# Altium schematic symbol library jlcpcb_2025_04_capacitors_extended_0402.schlib: 3594 symbols (part 6 of 20) (continued)
## C1005NP0180KGTS (continued)
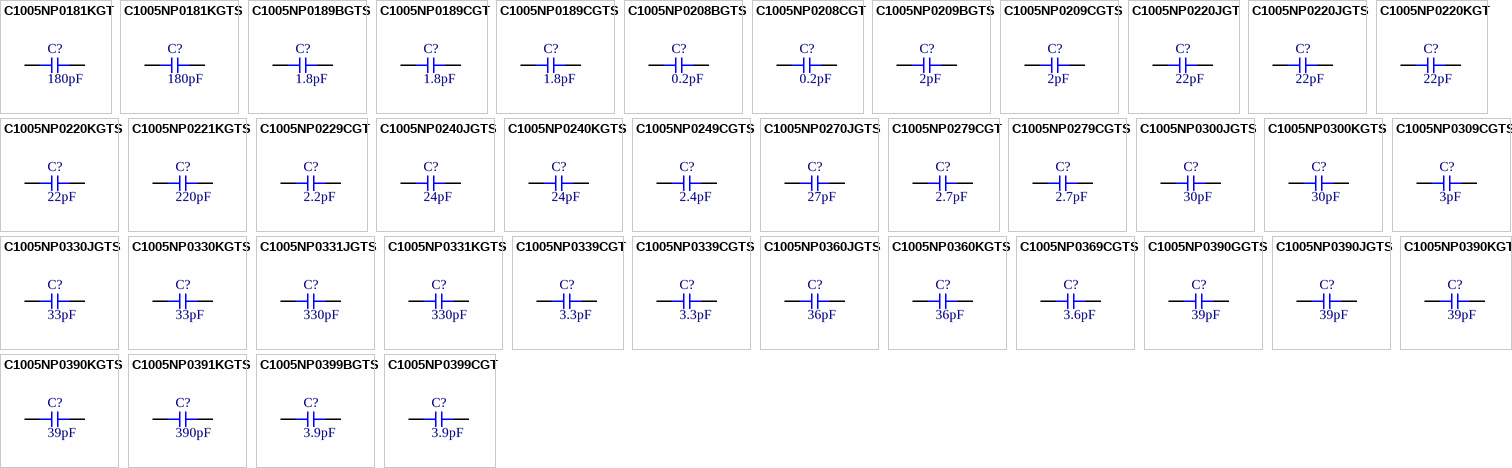
[diagram p24: symbols C1005NP0181KGT to C1005NP0399CGT]

## C1005NP0181KGT
designator C?  Capacitance: 180pF  (hidden comment: *)
Capacitor, Ceramic (MLCC), 180pF, ±10%, 50V, NP0, ±10%, SMD 0402; Manufacturer: Darfon Elec; Manufacturer Part Number: C1005NP0181KGT; Package Size: 0402; JLCPCB Basic Part: No; JLCPCB Part Number: C267388; Supplier 1: LCSC; Category: Capacitors - MLCC; Supplier Part Number 1: C267388; Tolerance: ±10%; Voltage Rating: 50V; Temperature Coefficient: NP0; RoHS: Yes; ComponentLink1Description: Datasheet; ComponentLink1URL: https://wmsc.lcsc.com/wmsc/upload/file/pdf/v2/lcsc/2304140030_Darfon-Elec-C1005NP0181KGT_C267388.pdf; ComponentLink2Description: JLCPCB Part URL; ComponentLink2URL: https://jlcpcb.com/partdetail/C267388; ComponentLink3Description: LCSC Part URL; ComponentLink3URL: https://lcsc.com/product-detail/Multilayer-Ceramic-Capacitors-MLCC---SMD-SMT_Darfon-Elec-Darfon-Elec-C1005NP0181KGT_C267388.html
footprint CAP-0402 (0402 (1005M) Capacitor)
pins: 1, 2

## C1005NP0181KGTS
designator C?  Capacitance: 180pF  (hidden comment: *)
Capacitor, Ceramic (MLCC), 180pF, ±10%, 50V, NP0, ±10%, SMD 0402; Manufacturer: Darfon Elec; Manufacturer Part Number: C1005NP0181KGTS; Package Size: 0402; JLCPCB Basic Part: No; JLCPCB Part Number: C312092; Supplier 1: LCSC; Category: Capacitors - MLCC; Supplier Part Number 1: C312092; Tolerance: ±10%; Voltage Rating: 50V; Temperature Coefficient: NP0; RoHS: Yes; ComponentLink1Description: Datasheet; ComponentLink1URL: https://wmsc.lcsc.com/wmsc/upload/file/pdf/v2/lcsc/2304140030_Darfon-Elec-C1005NP0181KGTS_C312092.pdf; ComponentLink2Description: JLCPCB Part URL; ComponentLink2URL: https://jlcpcb.com/partdetail/C312092; ComponentLink3Description: LCSC Part URL; ComponentLink3URL: https://lcsc.com/product-detail/Multilayer-Ceramic-Capacitors-MLCC---SMD-SMT_Darfon-Elec-Darfon-Elec-C1005NP0181KGTS_C312092.html
footprint CAP-0402 (0402 (1005M) Capacitor)
pins: 1, 2

## C1005NP0189BGTS
designator C?  Capacitance: 1.8pF  (hidden comment: *)
Capacitor, Ceramic (MLCC), 1.8pF, 50V, NP0, SMD 0402; Manufacturer: Darfon Elec; Manufacturer Part Number: C1005NP0189BGTS; Package Size: 0402; JLCPCB Basic Part: No; JLCPCB Part Number: C147345; Supplier 1: LCSC; Category: Capacitors - MLCC; Supplier Part Number 1: C147345; Voltage Rating: 50V; Temperature Coefficient: NP0; RoHS: Yes; ComponentLink1Description: Datasheet; ComponentLink1URL: https://wmsc.lcsc.com/wmsc/upload/file/pdf/v2/lcsc/2304140030_Darfon-Elec-C1005NP0189BGTS_C147345.pdf; ComponentLink2Description: JLCPCB Part URL; ComponentLink2URL: https://jlcpcb.com/partdetail/C147345; ComponentLink3Description: LCSC Part URL; ComponentLink3URL: https://lcsc.com/product-detail/Multilayer-Ceramic-Capacitors-MLCC---SMD-SMT_Darfon-Elec-Darfon-Elec-C1005NP0189BGTS_C147345.html
footprint CAP-0402 (0402 (1005M) Capacitor)
pins: 1, 2

## C1005NP0189CGT
designator C?  Capacitance: 1.8pF  (hidden comment: *)
Capacitor, Ceramic (MLCC), 1.8pF, 50V, NP0, SMD 0402; Manufacturer: Darfon Elec; Manufacturer Part Number: C1005NP0189CGT; Package Size: 0402; JLCPCB Basic Part: No; JLCPCB Part Number: C258489; Supplier 1: LCSC; Category: Capacitors - MLCC; Supplier Part Number 1: C258489; Voltage Rating: 50V; Temperature Coefficient: NP0; RoHS: Yes; ComponentLink1Description: Datasheet; ComponentLink1URL: https://wmsc.lcsc.com/wmsc/upload/file/pdf/v2/lcsc/2304140030_Darfon-Elec-C1005NP0189CGT_C258489.pdf; ComponentLink2Description: JLCPCB Part URL; ComponentLink2URL: https://jlcpcb.com/partdetail/C258489; ComponentLink3Description: LCSC Part URL; ComponentLink3URL: https://lcsc.com/product-detail/Multilayer-Ceramic-Capacitors-MLCC---SMD-SMT_Darfon-Elec-Darfon-Elec-C1005NP0189CGT_C258489.html
footprint CAP-0402 (0402 (1005M) Capacitor)
pins: 1, 2

## C1005NP0189CGTS
designator C?  Capacitance: 1.8pF  (hidden comment: *)
Capacitor, Ceramic (MLCC), 1.8pF, 50V, NP0, SMD 0402; Manufacturer: Darfon Elec; Manufacturer Part Number: C1005NP0189CGTS; Package Size: 0402; JLCPCB Basic Part: No; JLCPCB Part Number: C147346; Supplier 1: LCSC; Category: Capacitors - MLCC; Supplier Part Number 1: C147346; Voltage Rating: 50V; Temperature Coefficient: NP0; RoHS: Yes; ComponentLink1Description: Datasheet; ComponentLink1URL: https://wmsc.lcsc.com/wmsc/upload/file/pdf/v2/lcsc/2304140030_Darfon-Elec-C1005NP0189CGTS_C147346.pdf; ComponentLink2Description: JLCPCB Part URL; ComponentLink2URL: https://jlcpcb.com/partdetail/C147346; ComponentLink3Description: LCSC Part URL; ComponentLink3URL: https://lcsc.com/product-detail/Multilayer-Ceramic-Capacitors-MLCC---SMD-SMT_Darfon-Elec-Darfon-Elec-C1005NP0189CGTS_C147346.html
footprint CAP-0402 (0402 (1005M) Capacitor)
pins: 1, 2

## C1005NP0208BGTS
designator C?  Capacitance: 0.2pF  (hidden comment: *)
Capacitor, Ceramic (MLCC), 0.2pF, 50V, NP0, SMD 0402; Manufacturer: Darfon Elec; Manufacturer Part Number: C1005NP0208BGTS; Package Size: 0402; JLCPCB Basic Part: No; JLCPCB Part Number: C147318; Supplier 1: LCSC; Category: Capacitors - MLCC; Supplier Part Number 1: C147318; Voltage Rating: 50V; Temperature Coefficient: NP0; RoHS: Yes; ComponentLink1Description: Datasheet; ComponentLink1URL: https://wmsc.lcsc.com/wmsc/upload/file/pdf/v2/lcsc/2304140030_Darfon-Elec-C1005NP0208BGTS_C147318.pdf; ComponentLink2Description: JLCPCB Part URL; ComponentLink2URL: https://jlcpcb.com/partdetail/C147318; ComponentLink3Description: LCSC Part URL; ComponentLink3URL: https://lcsc.com/product-detail/Multilayer-Ceramic-Capacitors-MLCC---SMD-SMT_Darfon-Elec-Darfon-Elec-C1005NP0208BGTS_C147318.html
footprint CAP-0402 (0402 (1005M) Capacitor)
pins: 1, 2

## C1005NP0208CGT
designator C?  Capacitance: 0.2pF  (hidden comment: *)
Capacitor, Ceramic (MLCC), 0.2pF, 50V, NP0, SMD 0402; Manufacturer: Darfon Elec; Manufacturer Part Number: C1005NP0208CGT; Package Size: 0402; JLCPCB Basic Part: No; JLCPCB Part Number: C267404; Supplier 1: LCSC; Category: Capacitors - MLCC; Supplier Part Number 1: C267404; Voltage Rating: 50V; Temperature Coefficient: NP0; RoHS: Yes; ComponentLink1Description: Datasheet; ComponentLink1URL: https://wmsc.lcsc.com/wmsc/upload/file/pdf/v2/lcsc/2304140030_Darfon-Elec-C1005NP0208CGT_C267404.pdf; ComponentLink2Description: JLCPCB Part URL; ComponentLink2URL: https://jlcpcb.com/partdetail/C267404; ComponentLink3Description: LCSC Part URL; ComponentLink3URL: https://lcsc.com/product-detail/Multilayer-Ceramic-Capacitors-MLCC---SMD-SMT_Darfon-Elec-Darfon-Elec-C1005NP0208CGT_C267404.html
footprint CAP-0402 (0402 (1005M) Capacitor)
pins: 1, 2

## C1005NP0209BGTS
designator C?  Capacitance: 2pF  (hidden comment: *)
Capacitor, Ceramic (MLCC), 2pF, 50V, NP0, SMD 0402; Manufacturer: Darfon Elec; Manufacturer Part Number: C1005NP0209BGTS; Package Size: 0402; JLCPCB Basic Part: No; JLCPCB Part Number: C147347; Supplier 1: LCSC; Category: Capacitors - MLCC; Supplier Part Number 1: C147347; Voltage Rating: 50V; Temperature Coefficient: NP0; RoHS: Yes; ComponentLink1Description: Datasheet; ComponentLink1URL: https://wmsc.lcsc.com/wmsc/upload/file/pdf/v2/lcsc/2304140030_Darfon-Elec-C1005NP0209BGTS_C147347.pdf; ComponentLink2Description: JLCPCB Part URL; ComponentLink2URL: https://jlcpcb.com/partdetail/C147347; ComponentLink3Description: LCSC Part URL; ComponentLink3URL: https://lcsc.com/product-detail/Multilayer-Ceramic-Capacitors-MLCC---SMD-SMT_Darfon-Elec-Darfon-Elec-C1005NP0209BGTS_C147347.html
footprint CAP-0402 (0402 (1005M) Capacitor)
pins: 1, 2

## C1005NP0209CGTS
designator C?  Capacitance: 2pF  (hidden comment: *)
Capacitor, Ceramic (MLCC), 2pF, 50V, NP0, SMD 0402; Manufacturer: Darfon Elec; Manufacturer Part Number: C1005NP0209CGTS; Package Size: 0402; JLCPCB Basic Part: No; JLCPCB Part Number: C147348; Supplier 1: LCSC; Category: Capacitors - MLCC; Supplier Part Number 1: C147348; Voltage Rating: 50V; Temperature Coefficient: NP0; RoHS: Yes; ComponentLink1Description: Datasheet; ComponentLink1URL: https://wmsc.lcsc.com/wmsc/upload/file/pdf/v2/lcsc/2304140030_Darfon-Elec-C1005NP0209CGTS_C147348.pdf; ComponentLink2Description: JLCPCB Part URL; ComponentLink2URL: https://jlcpcb.com/partdetail/C147348; ComponentLink3Description: LCSC Part URL; ComponentLink3URL: https://lcsc.com/product-detail/Multilayer-Ceramic-Capacitors-MLCC---SMD-SMT_Darfon-Elec-Darfon-Elec-C1005NP0209CGTS_C147348.html
footprint CAP-0402 (0402 (1005M) Capacitor)
pins: 1, 2

## C1005NP0220JGT
designator C?  Capacitance: 22pF  (hidden comment: *)
Capacitor, Ceramic (MLCC), 22pF, ±5%, 50V, NP0, ±5%, SMD 0402; Manufacturer: Darfon Elec; Manufacturer Part Number: C1005NP0220JGT; Package Size: 0402; JLCPCB Basic Part: No; JLCPCB Part Number: C258503; Supplier 1: LCSC; Category: Capacitors - MLCC; Supplier Part Number 1: C258503; Tolerance: ±5%; Voltage Rating: 50V; Temperature Coefficient: NP0; RoHS: Yes; ComponentLink1Description: Datasheet; ComponentLink1URL: https://wmsc.lcsc.com/wmsc/upload/file/pdf/v2/lcsc/2304140030_Darfon-Elec-C1005NP0220JGT_C258503.pdf; ComponentLink2Description: JLCPCB Part URL; ComponentLink2URL: https://jlcpcb.com/partdetail/C258503; ComponentLink3Description: LCSC Part URL; ComponentLink3URL: https://lcsc.com/product-detail/Multilayer-Ceramic-Capacitors-MLCC---SMD-SMT_Darfon-Elec-Darfon-Elec-C1005NP0220JGT_C258503.html
footprint CAP-0402 (0402 (1005M) Capacitor)
pins: 1, 2

## C1005NP0220JGTS
designator C?  Capacitance: 22pF  (hidden comment: *)
Capacitor, Ceramic (MLCC), 22pF, ±5%, 50V, NP0, ±5%, SMD 0402; Manufacturer: Darfon Elec; Manufacturer Part Number: C1005NP0220JGTS; Package Size: 0402; JLCPCB Basic Part: No; JLCPCB Part Number: C147430; Supplier 1: LCSC; Category: Capacitors - MLCC; Supplier Part Number 1: C147430; Tolerance: ±5%; Voltage Rating: 50V; Temperature Coefficient: NP0; RoHS: Yes; ComponentLink1Description: Datasheet; ComponentLink1URL: https://wmsc.lcsc.com/wmsc/upload/file/pdf/v2/lcsc/2304140030_Darfon-Elec-C1005NP0220JGTS_C147430.pdf; ComponentLink2Description: JLCPCB Part URL; ComponentLink2URL: https://jlcpcb.com/partdetail/C147430; ComponentLink3Description: LCSC Part URL; ComponentLink3URL: https://lcsc.com/product-detail/Multilayer-Ceramic-Capacitors-MLCC---SMD-SMT_Darfon-Elec-Darfon-Elec-C1005NP0220JGTS_C147430.html
footprint CAP-0402 (0402 (1005M) Capacitor)
pins: 1, 2

## C1005NP0220KGT
designator C?  Capacitance: 22pF  (hidden comment: *)
Capacitor, Ceramic (MLCC), 22pF, ±10%, 50V, NP0, ±10%, SMD 0402; Manufacturer: Darfon Elec; Manufacturer Part Number: C1005NP0220KGT; Package Size: 0402; JLCPCB Basic Part: No; JLCPCB Part Number: C267389; Supplier 1: LCSC; Category: Capacitors - MLCC; Supplier Part Number 1: C267389; Tolerance: ±10%; Voltage Rating: 50V; Temperature Coefficient: NP0; RoHS: Yes; ComponentLink1Description: Datasheet; ComponentLink1URL: https://wmsc.lcsc.com/wmsc/upload/file/pdf/v2/lcsc/2304140030_Darfon-Elec-C1005NP0220KGT_C267389.pdf; ComponentLink2Description: JLCPCB Part URL; ComponentLink2URL: https://jlcpcb.com/partdetail/C267389; ComponentLink3Description: LCSC Part URL; ComponentLink3URL: https://lcsc.com/product-detail/Multilayer-Ceramic-Capacitors-MLCC---SMD-SMT_Darfon-Elec-Darfon-Elec-C1005NP0220KGT_C267389.html
footprint CAP-0402 (0402 (1005M) Capacitor)
pins: 1, 2

## C1005NP0220KGTS
designator C?  Capacitance: 22pF  (hidden comment: *)
Capacitor, Ceramic (MLCC), 22pF, ±10%, 50V, NP0, ±10%, SMD 0402; Manufacturer: Darfon Elec; Manufacturer Part Number: C1005NP0220KGTS; Package Size: 0402; JLCPCB Basic Part: No; JLCPCB Part Number: C312081; Supplier 1: LCSC; Category: Capacitors - MLCC; Supplier Part Number 1: C312081; Tolerance: ±10%; Voltage Rating: 50V; Temperature Coefficient: NP0; RoHS: Yes; ComponentLink1Description: Datasheet; ComponentLink1URL: https://wmsc.lcsc.com/wmsc/upload/file/pdf/v2/lcsc/2304140030_Darfon-Elec-C1005NP0220KGTS_C312081.pdf; ComponentLink2Description: JLCPCB Part URL; ComponentLink2URL: https://jlcpcb.com/partdetail/C312081; ComponentLink3Description: LCSC Part URL; ComponentLink3URL: https://lcsc.com/product-detail/Multilayer-Ceramic-Capacitors-MLCC---SMD-SMT_Darfon-Elec-Darfon-Elec-C1005NP0220KGTS_C312081.html
footprint CAP-0402 (0402 (1005M) Capacitor)
pins: 1, 2

## C1005NP0221KGTS
designator C?  Capacitance: 220pF  (hidden comment: *)
Capacitor, Ceramic (MLCC), 220pF, ±10%, 50V, NP0, ±10%, SMD 0402; Manufacturer: Darfon Elec; Manufacturer Part Number: C1005NP0221KGTS; Package Size: 0402; JLCPCB Basic Part: No; JLCPCB Part Number: C312080; Supplier 1: LCSC; Category: Capacitors - MLCC; Supplier Part Number 1: C312080; Tolerance: ±10%; Voltage Rating: 50V; Temperature Coefficient: NP0; RoHS: Yes; ComponentLink1Description: Datasheet; ComponentLink1URL: https://wmsc.lcsc.com/wmsc/upload/file/pdf/v2/lcsc/2304140030_Darfon-Elec-C1005NP0221KGTS_C312080.pdf; ComponentLink2Description: JLCPCB Part URL; ComponentLink2URL: https://jlcpcb.com/partdetail/C312080; ComponentLink3Description: LCSC Part URL; ComponentLink3URL: https://lcsc.com/product-detail/Multilayer-Ceramic-Capacitors-MLCC---SMD-SMT_Darfon-Elec-Darfon-Elec-C1005NP0221KGTS_C312080.html
footprint CAP-0402 (0402 (1005M) Capacitor)
pins: 1, 2

## C1005NP0229CGT
designator C?  Capacitance: 2.2pF  (hidden comment: *)
Capacitor, Ceramic (MLCC), 2.2pF, 50V, NP0, SMD 0402; Manufacturer: Darfon Elec; Manufacturer Part Number: C1005NP0229CGT; Package Size: 0402; JLCPCB Basic Part: No; JLCPCB Part Number: C258490; Supplier 1: LCSC; Category: Capacitors - MLCC; Supplier Part Number 1: C258490; Voltage Rating: 50V; Temperature Coefficient: NP0; RoHS: Yes; ComponentLink1Description: Datasheet; ComponentLink1URL: https://wmsc.lcsc.com/wmsc/upload/file/pdf/v2/lcsc/2304140030_Darfon-Elec-C1005NP0229CGT_C258490.pdf; ComponentLink2Description: JLCPCB Part URL; ComponentLink2URL: https://jlcpcb.com/partdetail/C258490; ComponentLink3Description: LCSC Part URL; ComponentLink3URL: https://lcsc.com/product-detail/Multilayer-Ceramic-Capacitors-MLCC---SMD-SMT_Darfon-Elec-Darfon-Elec-C1005NP0229CGT_C258490.html
footprint CAP-0402 (0402 (1005M) Capacitor)
pins: 1, 2

## C1005NP0240JGTS
designator C?  Capacitance: 24pF  (hidden comment: *)
Capacitor, Ceramic (MLCC), 24pF, ±5%, 50V, NP0, ±5%, SMD 0402; Manufacturer: Darfon Elec; Manufacturer Part Number: C1005NP0240JGTS; Package Size: 0402; JLCPCB Basic Part: No; JLCPCB Part Number: C147433; Supplier 1: LCSC; Category: Capacitors - MLCC; Supplier Part Number 1: C147433; Tolerance: ±5%; Voltage Rating: 50V; Temperature Coefficient: NP0; RoHS: Yes; ComponentLink1Description: Datasheet; ComponentLink1URL: https://wmsc.lcsc.com/wmsc/upload/file/pdf/v2/lcsc/2304140030_Darfon-Elec-C1005NP0240JGTS_C147433.pdf; ComponentLink2Description: JLCPCB Part URL; ComponentLink2URL: https://jlcpcb.com/partdetail/C147433; ComponentLink3Description: LCSC Part URL; ComponentLink3URL: https://lcsc.com/product-detail/Multilayer-Ceramic-Capacitors-MLCC---SMD-SMT_Darfon-Elec-Darfon-Elec-C1005NP0240JGTS_C147433.html
footprint CAP-0402 (0402 (1005M) Capacitor)
pins: 1, 2

## C1005NP0240KGTS
designator C?  Capacitance: 24pF  (hidden comment: *)
Capacitor, Ceramic (MLCC), 24pF, ±10%, 50V, NP0, ±10%, SMD 0402; Manufacturer: Darfon Elec; Manufacturer Part Number: C1005NP0240KGTS; Package Size: 0402; JLCPCB Basic Part: No; JLCPCB Part Number: C312074; Supplier 1: LCSC; Category: Capacitors - MLCC; Supplier Part Number 1: C312074; Tolerance: ±10%; Voltage Rating: 50V; Temperature Coefficient: NP0; RoHS: Yes; ComponentLink1Description: Datasheet; ComponentLink1URL: https://wmsc.lcsc.com/wmsc/upload/file/pdf/v2/lcsc/2304140030_Darfon-Elec-C1005NP0240KGTS_C312074.pdf; ComponentLink2Description: JLCPCB Part URL; ComponentLink2URL: https://jlcpcb.com/partdetail/C312074; ComponentLink3Description: LCSC Part URL; ComponentLink3URL: https://lcsc.com/product-detail/Multilayer-Ceramic-Capacitors-MLCC---SMD-SMT_Darfon-Elec-Darfon-Elec-C1005NP0240KGTS_C312074.html
footprint CAP-0402 (0402 (1005M) Capacitor)
pins: 1, 2

## C1005NP0249CGTS
designator C?  Capacitance: 2.4pF  (hidden comment: *)
Capacitor, Ceramic (MLCC), 2.4pF, 50V, NP0, SMD 0402; Manufacturer: Darfon Elec; Manufacturer Part Number: C1005NP0249CGTS; Package Size: 0402; JLCPCB Basic Part: No; JLCPCB Part Number: C561180; Supplier 1: LCSC; Category: Capacitors - MLCC; Supplier Part Number 1: C561180; Voltage Rating: 50V; Temperature Coefficient: NP0; RoHS: Yes; ComponentLink1Description: Datasheet; ComponentLink1URL: https://wmsc.lcsc.com/wmsc/upload/file/pdf/v2/lcsc/2006011904_Darfon-Elec-C1005NP0249CGTS_C561180.pdf; ComponentLink2Description: JLCPCB Part URL; ComponentLink2URL: https://jlcpcb.com/partdetail/C561180; ComponentLink3Description: LCSC Part URL; ComponentLink3URL: https://lcsc.com/product-detail/Multilayer-Ceramic-Capacitors-MLCC---SMD-SMT_Darfon-Elec-Darfon-Elec-C1005NP0249CGTS_C561180.html
footprint CAP-0402 (0402 (1005M) Capacitor)
pins: 1, 2

## C1005NP0270JGTS
designator C?  Capacitance: 27pF  (hidden comment: *)
Capacitor, Ceramic (MLCC), 27pF, ±5%, 50V, NP0, ±5%, SMD 0402; Manufacturer: Darfon Elec; Manufacturer Part Number: C1005NP0270JGTS; Package Size: 0402; JLCPCB Basic Part: No; JLCPCB Part Number: C147436; Supplier 1: LCSC; Category: Capacitors - MLCC; Supplier Part Number 1: C147436; Tolerance: ±5%; Voltage Rating: 50V; Temperature Coefficient: NP0; RoHS: Yes; ComponentLink1Description: Datasheet; ComponentLink1URL: https://wmsc.lcsc.com/wmsc/upload/file/pdf/v2/lcsc/2304140030_Darfon-Elec-C1005NP0270JGTS_C147436.pdf; ComponentLink2Description: JLCPCB Part URL; ComponentLink2URL: https://jlcpcb.com/partdetail/C147436; ComponentLink3Description: LCSC Part URL; ComponentLink3URL: https://lcsc.com/product-detail/Multilayer-Ceramic-Capacitors-MLCC---SMD-SMT_Darfon-Elec-Darfon-Elec-C1005NP0270JGTS_C147436.html
footprint CAP-0402 (0402 (1005M) Capacitor)
pins: 1, 2

## C1005NP0279CGT
designator C?  Capacitance: 2.7pF  (hidden comment: *)
Capacitor, Ceramic (MLCC), 2.7pF, 50V, NP0, SMD 0402; Manufacturer: Darfon Elec; Manufacturer Part Number: C1005NP0279CGT; Package Size: 0402; JLCPCB Basic Part: No; JLCPCB Part Number: C258491; Supplier 1: LCSC; Category: Capacitors - MLCC; Supplier Part Number 1: C258491; Voltage Rating: 50V; Temperature Coefficient: NP0; RoHS: Yes; ComponentLink1Description: Datasheet; ComponentLink1URL: https://wmsc.lcsc.com/wmsc/upload/file/pdf/v2/lcsc/2304140030_Darfon-Elec-C1005NP0279CGT_C258491.pdf; ComponentLink2Description: JLCPCB Part URL; ComponentLink2URL: https://jlcpcb.com/partdetail/C258491; ComponentLink3Description: LCSC Part URL; ComponentLink3URL: https://lcsc.com/product-detail/Multilayer-Ceramic-Capacitors-MLCC---SMD-SMT_Darfon-Elec-Darfon-Elec-C1005NP0279CGT_C258491.html
footprint CAP-0402 (0402 (1005M) Capacitor)
pins: 1, 2

## C1005NP0279CGTS
designator C?  Capacitance: 2.7pF  (hidden comment: *)
Capacitor, Ceramic (MLCC), 2.7pF, 50V, NP0, SMD 0402; Manufacturer: Darfon Elec; Manufacturer Part Number: C1005NP0279CGTS; Package Size: 0402; JLCPCB Basic Part: No; JLCPCB Part Number: C147354; Supplier 1: LCSC; Category: Capacitors - MLCC; Supplier Part Number 1: C147354; Voltage Rating: 50V; Temperature Coefficient: NP0; RoHS: Yes; ComponentLink1Description: Datasheet; ComponentLink1URL: https://wmsc.lcsc.com/wmsc/upload/file/pdf/v2/lcsc/2304140030_Darfon-Elec-C1005NP0279CGTS_C147354.pdf; ComponentLink2Description: JLCPCB Part URL; ComponentLink2URL: https://jlcpcb.com/partdetail/C147354; ComponentLink3Description: LCSC Part URL; ComponentLink3URL: https://lcsc.com/product-detail/Multilayer-Ceramic-Capacitors-MLCC---SMD-SMT_Darfon-Elec-Darfon-Elec-C1005NP0279CGTS_C147354.html
footprint CAP-0402 (0402 (1005M) Capacitor)
pins: 1, 2

## C1005NP0300JGTS
designator C?  Capacitance: 30pF  (hidden comment: *)
Capacitor, Ceramic (MLCC), 30pF, ±5%, 50V, NP0, ±5%, SMD 0402; Manufacturer: Darfon Elec; Manufacturer Part Number: C1005NP0300JGTS; Package Size: 0402; JLCPCB Basic Part: No; JLCPCB Part Number: C147439; Supplier 1: LCSC; Category: Capacitors - MLCC; Supplier Part Number 1: C147439; Tolerance: ±5%; Voltage Rating: 50V; Temperature Coefficient: NP0; RoHS: Yes; ComponentLink1Description: Datasheet; ComponentLink1URL: https://wmsc.lcsc.com/wmsc/upload/file/pdf/v2/lcsc/2304140030_Darfon-Elec-C1005NP0300JGTS_C147439.pdf; ComponentLink2Description: JLCPCB Part URL; ComponentLink2URL: https://jlcpcb.com/partdetail/C147439; ComponentLink3Description: LCSC Part URL; ComponentLink3URL: https://lcsc.com/product-detail/Multilayer-Ceramic-Capacitors-MLCC---SMD-SMT_Darfon-Elec-Darfon-Elec-C1005NP0300JGTS_C147439.html
footprint CAP-0402 (0402 (1005M) Capacitor)
pins: 1, 2

## C1005NP0300KGTS
designator C?  Capacitance: 30pF  (hidden comment: *)
Capacitor, Ceramic (MLCC), 30pF, ±10%, 50V, NP0, ±10%, SMD 0402; Manufacturer: Darfon Elec; Manufacturer Part Number: C1005NP0300KGTS; Package Size: 0402; JLCPCB Basic Part: No; JLCPCB Part Number: C312063; Supplier 1: LCSC; Category: Capacitors - MLCC; Supplier Part Number 1: C312063; Tolerance: ±10%; Voltage Rating: 50V; Temperature Coefficient: NP0; RoHS: Yes; ComponentLink1Description: Datasheet; ComponentLink1URL: https://wmsc.lcsc.com/wmsc/upload/file/pdf/v2/lcsc/2304140030_Darfon-Elec-C1005NP0300KGTS_C312063.pdf; ComponentLink2Description: JLCPCB Part URL; ComponentLink2URL: https://jlcpcb.com/partdetail/C312063; ComponentLink3Description: LCSC Part URL; ComponentLink3URL: https://lcsc.com/product-detail/Multilayer-Ceramic-Capacitors-MLCC---SMD-SMT_Darfon-Elec-Darfon-Elec-C1005NP0300KGTS_C312063.html
footprint CAP-0402 (0402 (1005M) Capacitor)
pins: 1, 2

## C1005NP0309CGTS
designator C?  Capacitance: 3pF  (hidden comment: *)
Capacitor, Ceramic (MLCC), 3pF, 50V, NP0, SMD 0402; Manufacturer: Darfon Elec; Manufacturer Part Number: C1005NP0309CGTS; Package Size: 0402; JLCPCB Basic Part: No; JLCPCB Part Number: C147357; Supplier 1: LCSC; Category: Capacitors - MLCC; Supplier Part Number 1: C147357; Voltage Rating: 50V; Temperature Coefficient: NP0; RoHS: Yes; ComponentLink1Description: Datasheet; ComponentLink1URL: https://wmsc.lcsc.com/wmsc/upload/file/pdf/v2/lcsc/2304140030_Darfon-Elec-C1005NP0309CGTS_C147357.pdf; ComponentLink2Description: JLCPCB Part URL; ComponentLink2URL: https://jlcpcb.com/partdetail/C147357; ComponentLink3Description: LCSC Part URL; ComponentLink3URL: https://lcsc.com/product-detail/Multilayer-Ceramic-Capacitors-MLCC---SMD-SMT_Darfon-Elec-Darfon-Elec-C1005NP0309CGTS_C147357.html
footprint CAP-0402 (0402 (1005M) Capacitor)
pins: 1, 2

## C1005NP0330JGTS
designator C?  Capacitance: 33pF  (hidden comment: *)
Capacitor, Ceramic (MLCC), 33pF, ±5%, 50V, NP0, ±5%, SMD 0402; Manufacturer: Darfon Elec; Manufacturer Part Number: C1005NP0330JGTS; Package Size: 0402; JLCPCB Basic Part: No; JLCPCB Part Number: C147442; Supplier 1: LCSC; Category: Capacitors - MLCC; Supplier Part Number 1: C147442; Tolerance: ±5%; Voltage Rating: 50V; Temperature Coefficient: NP0; RoHS: Yes; ComponentLink1Description: Datasheet; ComponentLink1URL: https://wmsc.lcsc.com/wmsc/upload/file/pdf/v2/lcsc/2304140030_Darfon-Elec-C1005NP0330JGTS_C147442.pdf; ComponentLink2Description: JLCPCB Part URL; ComponentLink2URL: https://jlcpcb.com/partdetail/C147442; ComponentLink3Description: LCSC Part URL; ComponentLink3URL: https://lcsc.com/product-detail/Multilayer-Ceramic-Capacitors-MLCC---SMD-SMT_Darfon-Elec-Darfon-Elec-C1005NP0330JGTS_C147442.html
footprint CAP-0402 (0402 (1005M) Capacitor)
pins: 1, 2

## C1005NP0330KGTS
designator C?  Capacitance: 33pF  (hidden comment: *)
Capacitor, Ceramic (MLCC), 33pF, ±10%, 50V, NP0, ±10%, SMD 0402; Manufacturer: Darfon Elec; Manufacturer Part Number: C1005NP0330KGTS; Package Size: 0402; JLCPCB Basic Part: No; JLCPCB Part Number: C312057; Supplier 1: LCSC; Category: Capacitors - MLCC; Supplier Part Number 1: C312057; Tolerance: ±10%; Voltage Rating: 50V; Temperature Coefficient: NP0; RoHS: Yes; ComponentLink1Description: Datasheet; ComponentLink1URL: https://wmsc.lcsc.com/wmsc/upload/file/pdf/v2/lcsc/2304140030_Darfon-Elec-C1005NP0330KGTS_C312057.pdf; ComponentLink2Description: JLCPCB Part URL; ComponentLink2URL: https://jlcpcb.com/partdetail/C312057; ComponentLink3Description: LCSC Part URL; ComponentLink3URL: https://lcsc.com/product-detail/Multilayer-Ceramic-Capacitors-MLCC---SMD-SMT_Darfon-Elec-Darfon-Elec-C1005NP0330KGTS_C312057.html
footprint CAP-0402 (0402 (1005M) Capacitor)
pins: 1, 2

## C1005NP0331JGTS
designator C?  Capacitance: 330pF  (hidden comment: *)
Capacitor, Ceramic (MLCC), 330pF, ±5%, 50V, NP0, ±5%, SMD 0402; Manufacturer: Darfon Elec; Manufacturer Part Number: C1005NP0331JGTS; Package Size: 0402; JLCPCB Basic Part: No; JLCPCB Part Number: C147486; Supplier 1: LCSC; Category: Capacitors - MLCC; Supplier Part Number 1: C147486; Tolerance: ±5%; Voltage Rating: 50V; Temperature Coefficient: NP0; RoHS: Yes; ComponentLink1Description: Datasheet; ComponentLink1URL: https://wmsc.lcsc.com/wmsc/upload/file/pdf/v2/lcsc/2304140030_Darfon-Elec-C1005NP0331JGTS_C147486.pdf; ComponentLink2Description: JLCPCB Part URL; ComponentLink2URL: https://jlcpcb.com/partdetail/C147486; ComponentLink3Description: LCSC Part URL; ComponentLink3URL: https://lcsc.com/product-detail/Multilayer-Ceramic-Capacitors-MLCC---SMD-SMT_Darfon-Elec-Darfon-Elec-C1005NP0331JGTS_C147486.html
footprint CAP-0402 (0402 (1005M) Capacitor)
pins: 1, 2

## C1005NP0331KGTS
designator C?  Capacitance: 330pF  (hidden comment: *)
Capacitor, Ceramic (MLCC), 330pF, ±10%, 50V, NP0, ±10%, SMD 0402; Manufacturer: Darfon Elec; Manufacturer Part Number: C1005NP0331KGTS; Package Size: 0402; JLCPCB Basic Part: No; JLCPCB Part Number: C312055; Supplier 1: LCSC; Category: Capacitors - MLCC; Supplier Part Number 1: C312055; Tolerance: ±10%; Voltage Rating: 50V; Temperature Coefficient: NP0; RoHS: Yes; ComponentLink1Description: Datasheet; ComponentLink1URL: https://wmsc.lcsc.com/wmsc/upload/file/pdf/v2/lcsc/2304140030_Darfon-Elec-C1005NP0331KGTS_C312055.pdf; ComponentLink2Description: JLCPCB Part URL; ComponentLink2URL: https://jlcpcb.com/partdetail/C312055; ComponentLink3Description: LCSC Part URL; ComponentLink3URL: https://lcsc.com/product-detail/Multilayer-Ceramic-Capacitors-MLCC---SMD-SMT_Darfon-Elec-Darfon-Elec-C1005NP0331KGTS_C312055.html
footprint CAP-0402 (0402 (1005M) Capacitor)
pins: 1, 2

## C1005NP0339CGT
designator C?  Capacitance: 3.3pF  (hidden comment: *)
Capacitor, Ceramic (MLCC), 3.3pF, 50V, NP0, SMD 0402; Manufacturer: Darfon Elec; Manufacturer Part Number: C1005NP0339CGT; Package Size: 0402; JLCPCB Basic Part: No; JLCPCB Part Number: C258492; Supplier 1: LCSC; Category: Capacitors - MLCC; Supplier Part Number 1: C258492; Voltage Rating: 50V; Temperature Coefficient: NP0; RoHS: Yes; ComponentLink1Description: Datasheet; ComponentLink1URL: https://wmsc.lcsc.com/wmsc/upload/file/pdf/v2/lcsc/2304140030_Darfon-Elec-C1005NP0339CGT_C258492.pdf; ComponentLink2Description: JLCPCB Part URL; ComponentLink2URL: https://jlcpcb.com/partdetail/C258492; ComponentLink3Description: LCSC Part URL; ComponentLink3URL: https://lcsc.com/product-detail/Multilayer-Ceramic-Capacitors-MLCC---SMD-SMT_Darfon-Elec-Darfon-Elec-C1005NP0339CGT_C258492.html
footprint CAP-0402 (0402 (1005M) Capacitor)
pins: 1, 2

## C1005NP0339CGTS
designator C?  Capacitance: 3.3pF  (hidden comment: *)
Capacitor, Ceramic (MLCC), 3.3pF, 50V, NP0, SMD 0402; Manufacturer: Darfon Elec; Manufacturer Part Number: C1005NP0339CGTS; Package Size: 0402; JLCPCB Basic Part: No; JLCPCB Part Number: C147359; Supplier 1: LCSC; Category: Capacitors - MLCC; Supplier Part Number 1: C147359; Voltage Rating: 50V; Temperature Coefficient: NP0; RoHS: Yes; ComponentLink1Description: Datasheet; ComponentLink1URL: https://wmsc.lcsc.com/wmsc/upload/file/pdf/v2/lcsc/2304140030_Darfon-Elec-C1005NP0339CGTS_C147359.pdf; ComponentLink2Description: JLCPCB Part URL; ComponentLink2URL: https://jlcpcb.com/partdetail/C147359; ComponentLink3Description: LCSC Part URL; ComponentLink3URL: https://lcsc.com/product-detail/Multilayer-Ceramic-Capacitors-MLCC---SMD-SMT_Darfon-Elec-Darfon-Elec-C1005NP0339CGTS_C147359.html
footprint CAP-0402 (0402 (1005M) Capacitor)
pins: 1, 2

## C1005NP0360JGTS
designator C?  Capacitance: 36pF  (hidden comment: *)
Capacitor, Ceramic (MLCC), 36pF, ±5%, 50V, NP0, ±5%, SMD 0402; Manufacturer: Darfon Elec; Manufacturer Part Number: C1005NP0360JGTS; Package Size: 0402; JLCPCB Basic Part: No; JLCPCB Part Number: C147445; Supplier 1: LCSC; Category: Capacitors - MLCC; Supplier Part Number 1: C147445; Tolerance: ±5%; Voltage Rating: 50V; Temperature Coefficient: NP0; RoHS: Yes; ComponentLink1Description: Datasheet; ComponentLink1URL: https://wmsc.lcsc.com/wmsc/upload/file/pdf/v2/lcsc/2304140030_Darfon-Elec-C1005NP0360JGTS_C147445.pdf; ComponentLink2Description: JLCPCB Part URL; ComponentLink2URL: https://jlcpcb.com/partdetail/C147445; ComponentLink3Description: LCSC Part URL; ComponentLink3URL: https://lcsc.com/product-detail/Multilayer-Ceramic-Capacitors-MLCC---SMD-SMT_Darfon-Elec-Darfon-Elec-C1005NP0360JGTS_C147445.html
footprint CAP-0402 (0402 (1005M) Capacitor)
pins: 1, 2

## C1005NP0360KGTS
designator C?  Capacitance: 36pF  (hidden comment: *)
Capacitor, Ceramic (MLCC), 36pF, ±10%, 50V, NP0, ±10%, SMD 0402; Manufacturer: Darfon Elec; Manufacturer Part Number: C1005NP0360KGTS; Package Size: 0402; JLCPCB Basic Part: No; JLCPCB Part Number: C312048; Supplier 1: LCSC; Category: Capacitors - MLCC; Supplier Part Number 1: C312048; Tolerance: ±10%; Voltage Rating: 50V; Temperature Coefficient: NP0; RoHS: Yes; ComponentLink1Description: Datasheet; ComponentLink1URL: https://wmsc.lcsc.com/wmsc/upload/file/pdf/v2/lcsc/2304140030_Darfon-Elec-C1005NP0360KGTS_C312048.pdf; ComponentLink2Description: JLCPCB Part URL; ComponentLink2URL: https://jlcpcb.com/partdetail/C312048; ComponentLink3Description: LCSC Part URL; ComponentLink3URL: https://lcsc.com/product-detail/Multilayer-Ceramic-Capacitors-MLCC---SMD-SMT_Darfon-Elec-Darfon-Elec-C1005NP0360KGTS_C312048.html
footprint CAP-0402 (0402 (1005M) Capacitor)
pins: 1, 2

## C1005NP0369CGTS
designator C?  Capacitance: 3.6pF  (hidden comment: *)
Capacitor, Ceramic (MLCC), 3.6pF, 50V, NP0, SMD 0402; Manufacturer: Darfon Elec; Manufacturer Part Number: C1005NP0369CGTS; Package Size: 0402; JLCPCB Basic Part: No; JLCPCB Part Number: C513749; Supplier 1: LCSC; Category: Capacitors - MLCC; Supplier Part Number 1: C513749; Voltage Rating: 50V; Temperature Coefficient: NP0; RoHS: Yes; ComponentLink1Description: Datasheet; ComponentLink1URL: https://wmsc.lcsc.com/wmsc/upload/file/pdf/v2/lcsc/2304140030_Darfon-Elec-C1005NP0369CGTS_C513749.pdf; ComponentLink2Description: JLCPCB Part URL; ComponentLink2URL: https://jlcpcb.com/partdetail/C513749; ComponentLink3Description: LCSC Part URL; ComponentLink3URL: https://lcsc.com/product-detail/Multilayer-Ceramic-Capacitors-MLCC---SMD-SMT_Darfon-Elec-Darfon-Elec-C1005NP0369CGTS_C513749.html
footprint CAP-0402 (0402 (1005M) Capacitor)
pins: 1, 2

## C1005NP0390GGTS
designator C?  Capacitance: 39pF  (hidden comment: *)
Capacitor, Ceramic (MLCC), 39pF, ±2%, 50V, NP0, ±2%, SMD 0402; Manufacturer: Darfon Elec; Manufacturer Part Number: C1005NP0390GGTS; Package Size: 0402; JLCPCB Basic Part: No; JLCPCB Part Number: C147447; Supplier 1: LCSC; Category: Capacitors - MLCC; Supplier Part Number 1: C147447; Tolerance: ±2%; Voltage Rating: 50V; Temperature Coefficient: NP0; RoHS: Yes; ComponentLink1Description: Datasheet; ComponentLink1URL: https://wmsc.lcsc.com/wmsc/upload/file/pdf/v2/lcsc/2304140030_Darfon-Elec-C1005NP0390GGTS_C147447.pdf; ComponentLink2Description: JLCPCB Part URL; ComponentLink2URL: https://jlcpcb.com/partdetail/C147447; ComponentLink3Description: LCSC Part URL; ComponentLink3URL: https://lcsc.com/product-detail/Multilayer-Ceramic-Capacitors-MLCC---SMD-SMT_Darfon-Elec-Darfon-Elec-C1005NP0390GGTS_C147447.html
footprint CAP-0402 (0402 (1005M) Capacitor)
pins: 1, 2

## C1005NP0390JGTS
designator C?  Capacitance: 39pF  (hidden comment: *)
Capacitor, Ceramic (MLCC), 39pF, ±5%, 50V, NP0, ±5%, SMD 0402; Manufacturer: Darfon Elec; Manufacturer Part Number: C1005NP0390JGTS; Package Size: 0402; JLCPCB Basic Part: No; JLCPCB Part Number: C147448; Supplier 1: LCSC; Category: Capacitors - MLCC; Supplier Part Number 1: C147448; Tolerance: ±5%; Voltage Rating: 50V; Temperature Coefficient: NP0; RoHS: Yes; ComponentLink1Description: Datasheet; ComponentLink1URL: https://wmsc.lcsc.com/wmsc/upload/file/pdf/v2/lcsc/2304140030_Darfon-Elec-C1005NP0390JGTS_C147448.pdf; ComponentLink2Description: JLCPCB Part URL; ComponentLink2URL: https://jlcpcb.com/partdetail/C147448; ComponentLink3Description: LCSC Part URL; ComponentLink3URL: https://lcsc.com/product-detail/Multilayer-Ceramic-Capacitors-MLCC---SMD-SMT_Darfon-Elec-Darfon-Elec-C1005NP0390JGTS_C147448.html
footprint CAP-0402 (0402 (1005M) Capacitor)
pins: 1, 2

## C1005NP0390KGT
designator C?  Capacitance: 39pF  (hidden comment: *)
Capacitor, Ceramic (MLCC), 39pF, ±10%, 50V, NP0, ±10%, SMD 0402; Manufacturer: Darfon Elec; Manufacturer Part Number: C1005NP0390KGT; Package Size: 0402; JLCPCB Basic Part: No; JLCPCB Part Number: C267395; Supplier 1: LCSC; Category: Capacitors - MLCC; Supplier Part Number 1: C267395; Tolerance: ±10%; Voltage Rating: 50V; Temperature Coefficient: NP0; RoHS: Yes; ComponentLink1Description: Datasheet; ComponentLink1URL: https://wmsc.lcsc.com/wmsc/upload/file/pdf/v2/lcsc/2304140030_Darfon-Elec-C1005NP0390KGT_C267395.pdf; ComponentLink2Description: JLCPCB Part URL; ComponentLink2URL: https://jlcpcb.com/partdetail/C267395; ComponentLink3Description: LCSC Part URL; ComponentLink3URL: https://lcsc.com/product-detail/Multilayer-Ceramic-Capacitors-MLCC---SMD-SMT_Darfon-Elec-Darfon-Elec-C1005NP0390KGT_C267395.html
footprint CAP-0402 (0402 (1005M) Capacitor)
pins: 1, 2

## C1005NP0390KGTS
designator C?  Capacitance: 39pF  (hidden comment: *)
Capacitor, Ceramic (MLCC), 39pF, ±10%, 50V, NP0, ±10%, SMD 0402; Manufacturer: Darfon Elec; Manufacturer Part Number: C1005NP0390KGTS; Package Size: 0402; JLCPCB Basic Part: No; JLCPCB Part Number: C312045; Supplier 1: LCSC; Category: Capacitors - MLCC; Supplier Part Number 1: C312045; Tolerance: ±10%; Voltage Rating: 50V; Temperature Coefficient: NP0; RoHS: Yes; ComponentLink1Description: Datasheet; ComponentLink1URL: https://wmsc.lcsc.com/wmsc/upload/file/pdf/v2/lcsc/2304140030_Darfon-Elec-C1005NP0390KGTS_C312045.pdf; ComponentLink2Description: JLCPCB Part URL; ComponentLink2URL: https://jlcpcb.com/partdetail/C312045; ComponentLink3Description: LCSC Part URL; ComponentLink3URL: https://lcsc.com/product-detail/Multilayer-Ceramic-Capacitors-MLCC---SMD-SMT_Darfon-Elec-Darfon-Elec-C1005NP0390KGTS_C312045.html
footprint CAP-0402 (0402 (1005M) Capacitor)
pins: 1, 2

## C1005NP0391KGTS
designator C?  Capacitance: 390pF  (hidden comment: *)
Capacitor, Ceramic (MLCC), 390pF, ±10%, 50V, NP0, ±10%, SMD 0402; Manufacturer: Darfon Elec; Manufacturer Part Number: C1005NP0391KGTS; Package Size: 0402; JLCPCB Basic Part: No; JLCPCB Part Number: C312044; Supplier 1: LCSC; Category: Capacitors - MLCC; Supplier Part Number 1: C312044; Tolerance: ±10%; Voltage Rating: 50V; Temperature Coefficient: NP0; RoHS: Yes; ComponentLink1Description: Datasheet; ComponentLink1URL: https://wmsc.lcsc.com/wmsc/upload/file/pdf/v2/lcsc/2304140030_Darfon-Elec-C1005NP0391KGTS_C312044.pdf; ComponentLink2Description: JLCPCB Part URL; ComponentLink2URL: https://jlcpcb.com/partdetail/C312044; ComponentLink3Description: LCSC Part URL; ComponentLink3URL: https://lcsc.com/product-detail/Multilayer-Ceramic-Capacitors-MLCC---SMD-SMT_Darfon-Elec-Darfon-Elec-C1005NP0391KGTS_C312044.html
footprint CAP-0402 (0402 (1005M) Capacitor)
pins: 1, 2

## C1005NP0399BGTS
designator C?  Capacitance: 3.9pF  (hidden comment: *)
Capacitor, Ceramic (MLCC), 3.9pF, 50V, NP0, SMD 0402; Manufacturer: Darfon Elec; Manufacturer Part Number: C1005NP0399BGTS; Package Size: 0402; JLCPCB Basic Part: No; JLCPCB Part Number: C561181; Supplier 1: LCSC; Category: Capacitors - MLCC; Supplier Part Number 1: C561181; Voltage Rating: 50V; Temperature Coefficient: NP0; RoHS: Yes; ComponentLink1Description: Datasheet; ComponentLink1URL: https://wmsc.lcsc.com/wmsc/upload/file/pdf/v2/lcsc/2006011904_Darfon-Elec-C1005NP0399BGTS_C561181.pdf; ComponentLink2Description: JLCPCB Part URL; ComponentLink2URL: https://jlcpcb.com/partdetail/C561181; ComponentLink3Description: LCSC Part URL; ComponentLink3URL: https://lcsc.com/product-detail/Multilayer-Ceramic-Capacitors-MLCC---SMD-SMT_Darfon-Elec-Darfon-Elec-C1005NP0399BGTS_C561181.html
footprint CAP-0402 (0402 (1005M) Capacitor)
pins: 1, 2

## C1005NP0399CGT
designator C?  Capacitance: 3.9pF  (hidden comment: *)
Capacitor, Ceramic (MLCC), 3.9pF, 50V, NP0, SMD 0402; Manufacturer: Darfon Elec; Manufacturer Part Number: C1005NP0399CGT; Package Size: 0402; JLCPCB Basic Part: No; JLCPCB Part Number: C258493; Supplier 1: LCSC; Category: Capacitors - MLCC; Supplier Part Number 1: C258493; Voltage Rating: 50V; Temperature Coefficient: NP0; RoHS: Yes; ComponentLink1Description: Datasheet; ComponentLink1URL: https://wmsc.lcsc.com/wmsc/upload/file/pdf/v2/lcsc/2304140030_Darfon-Elec-C1005NP0399CGT_C258493.pdf; ComponentLink2Description: JLCPCB Part URL; ComponentLink2URL: https://jlcpcb.com/partdetail/C258493; ComponentLink3Description: LCSC Part URL; ComponentLink3URL: https://lcsc.com/product-detail/Multilayer-Ceramic-Capacitors-MLCC---SMD-SMT_Darfon-Elec-Darfon-Elec-C1005NP0399CGT_C258493.html
footprint CAP-0402 (0402 (1005M) Capacitor)
pins: 1, 2

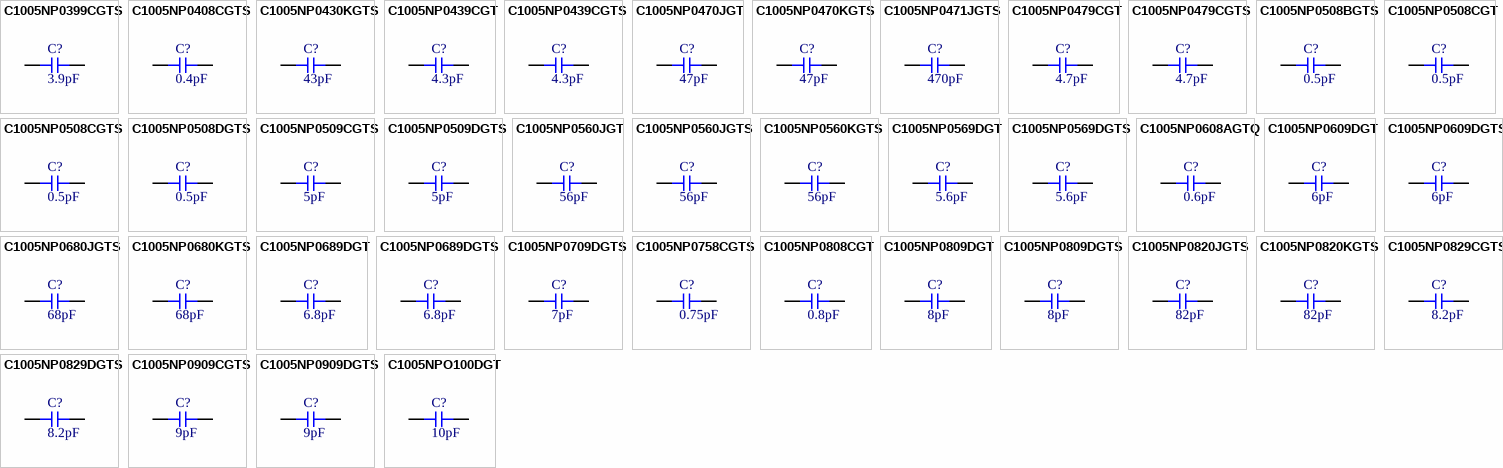
[diagram p25: symbols C1005NP0399CGTS to C1005NPO100DGT]

## C1005NP0399CGTS
designator C?  Capacitance: 3.9pF  (hidden comment: *)
Capacitor, Ceramic (MLCC), 3.9pF, 50V, NP0, SMD 0402; Manufacturer: Darfon Elec; Manufacturer Part Number: C1005NP0399CGTS; Package Size: 0402; JLCPCB Basic Part: No; JLCPCB Part Number: C147363; Supplier 1: LCSC; Category: Capacitors - MLCC; Supplier Part Number 1: C147363; Voltage Rating: 50V; Temperature Coefficient: NP0; RoHS: Yes; ComponentLink1Description: Datasheet; ComponentLink1URL: https://wmsc.lcsc.com/wmsc/upload/file/pdf/v2/lcsc/2304140030_Darfon-Elec-C1005NP0399CGTS_C147363.pdf; ComponentLink2Description: JLCPCB Part URL; ComponentLink2URL: https://jlcpcb.com/partdetail/C147363; ComponentLink3Description: LCSC Part URL; ComponentLink3URL: https://lcsc.com/product-detail/Multilayer-Ceramic-Capacitors-MLCC---SMD-SMT_Darfon-Elec-Darfon-Elec-C1005NP0399CGTS_C147363.html
footprint CAP-0402 (0402 (1005M) Capacitor)
pins: 1, 2

## C1005NP0408CGTS
designator C?  Capacitance: 0.4pF  (hidden comment: *)
Capacitor, Ceramic (MLCC), 0.4pF, 50V, NP0, SMD 0402; Manufacturer: Darfon Elec; Manufacturer Part Number: C1005NP0408CGTS; Package Size: 0402; JLCPCB Basic Part: No; JLCPCB Part Number: C312042; Supplier 1: LCSC; Category: Capacitors - MLCC; Supplier Part Number 1: C312042; Voltage Rating: 50V; Temperature Coefficient: NP0; RoHS: Yes; ComponentLink1Description: Datasheet; ComponentLink1URL: https://wmsc.lcsc.com/wmsc/upload/file/pdf/v2/lcsc/2304140030_Darfon-Elec-C1005NP0408CGTS_C312042.pdf; ComponentLink2Description: JLCPCB Part URL; ComponentLink2URL: https://jlcpcb.com/partdetail/C312042; ComponentLink3Description: LCSC Part URL; ComponentLink3URL: https://lcsc.com/product-detail/Multilayer-Ceramic-Capacitors-MLCC---SMD-SMT_Darfon-Elec-Darfon-Elec-C1005NP0408CGTS_C312042.html
footprint CAP-0402 (0402 (1005M) Capacitor)
pins: 1, 2

## C1005NP0430KGTS
designator C?  Capacitance: 43pF  (hidden comment: *)
Capacitor, Ceramic (MLCC), 43pF, ±10%, 50V, NP0, ±10%, SMD 0402; Manufacturer: Darfon Elec; Manufacturer Part Number: C1005NP0430KGTS; Package Size: 0402; JLCPCB Basic Part: No; JLCPCB Part Number: C312041; Supplier 1: LCSC; Category: Capacitors - MLCC; Supplier Part Number 1: C312041; Tolerance: ±10%; Voltage Rating: 50V; Temperature Coefficient: NP0; RoHS: Yes; ComponentLink1Description: Datasheet; ComponentLink1URL: https://wmsc.lcsc.com/wmsc/upload/file/pdf/v2/lcsc/2304140030_Darfon-Elec-C1005NP0430KGTS_C312041.pdf; ComponentLink2Description: JLCPCB Part URL; ComponentLink2URL: https://jlcpcb.com/partdetail/C312041; ComponentLink3Description: LCSC Part URL; ComponentLink3URL: https://lcsc.com/product-detail/Multilayer-Ceramic-Capacitors-MLCC---SMD-SMT_Darfon-Elec-Darfon-Elec-C1005NP0430KGTS_C312041.html
footprint CAP-0402 (0402 (1005M) Capacitor)
pins: 1, 2

## C1005NP0439CGT
designator C?  Capacitance: 4.3pF  (hidden comment: *)
Capacitor, Ceramic (MLCC), 4.3pF, 50V, NP0, SMD 0402; Manufacturer: Darfon Elec; Manufacturer Part Number: C1005NP0439CGT; Package Size: 0402; JLCPCB Basic Part: No; JLCPCB Part Number: C258494; Supplier 1: LCSC; Category: Capacitors - MLCC; Supplier Part Number 1: C258494; Voltage Rating: 50V; Temperature Coefficient: NP0; RoHS: Yes; ComponentLink1Description: Datasheet; ComponentLink1URL: https://wmsc.lcsc.com/wmsc/upload/file/pdf/v2/lcsc/2304140030_Darfon-Elec-C1005NP0439CGT_C258494.pdf; ComponentLink2Description: JLCPCB Part URL; ComponentLink2URL: https://jlcpcb.com/partdetail/C258494; ComponentLink3Description: LCSC Part URL; ComponentLink3URL: https://lcsc.com/product-detail/Multilayer-Ceramic-Capacitors-MLCC---SMD-SMT_Darfon-Elec-Darfon-Elec-C1005NP0439CGT_C258494.html
footprint CAP-0402 (0402 (1005M) Capacitor)
pins: 1, 2

## C1005NP0439CGTS
designator C?  Capacitance: 4.3pF  (hidden comment: *)
Capacitor, Ceramic (MLCC), 4.3pF, 50V, NP0, SMD 0402; Manufacturer: Darfon Elec; Manufacturer Part Number: C1005NP0439CGTS; Package Size: 0402; JLCPCB Basic Part: No; JLCPCB Part Number: C147367; Supplier 1: LCSC; Category: Capacitors - MLCC; Supplier Part Number 1: C147367; Voltage Rating: 50V; Temperature Coefficient: NP0; RoHS: Yes; ComponentLink1Description: Datasheet; ComponentLink1URL: https://wmsc.lcsc.com/wmsc/upload/file/pdf/v2/lcsc/2304140030_Darfon-Elec-C1005NP0439CGTS_C147367.pdf; ComponentLink2Description: JLCPCB Part URL; ComponentLink2URL: https://jlcpcb.com/partdetail/C147367; ComponentLink3Description: LCSC Part URL; ComponentLink3URL: https://lcsc.com/product-detail/Multilayer-Ceramic-Capacitors-MLCC---SMD-SMT_Darfon-Elec-Darfon-Elec-C1005NP0439CGTS_C147367.html
footprint CAP-0402 (0402 (1005M) Capacitor)
pins: 1, 2
